# Altium footprint library ThanhNT.PcbLib: 579 footprints (part 22 of 37)
Each footprint in its own frame and in the unit in brackets; x right, y up, seen from the top. Pads: shape width x height; smd on the part's side, far side on the other; paste and mask are expansions set on the pad; w line width, h text height; cw(c..) or ccw(c..) is an arc to the next point about the centre after c.
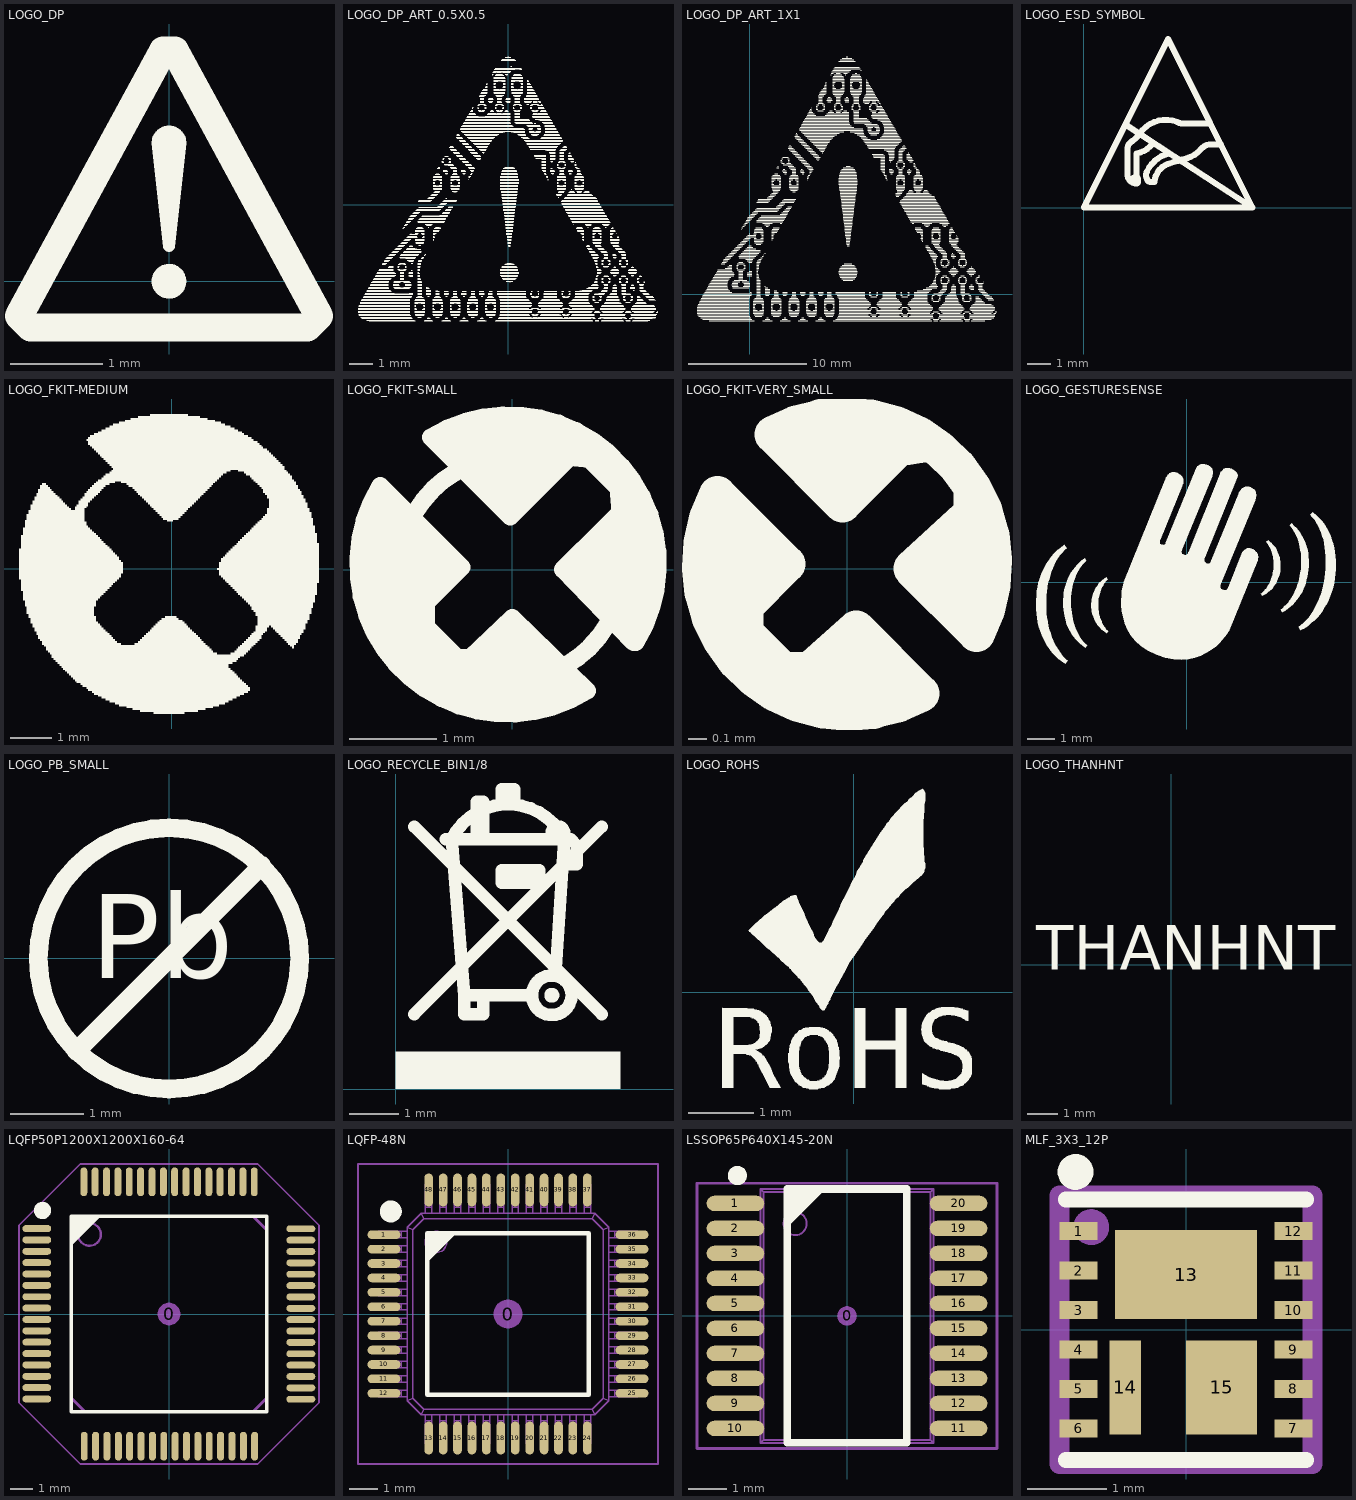
[diagram p21: the footprints below, top view; thin cyan lines are the x and y axes]

## LOGO_DP [mm] "Dangerous Prototype Logo"
Top Overlay:
  circle w0.127: c0,0 r0.125
  region: -0.102,0.102 0.076,0.102 0.076,-0.076 -0.102,-0.076
  region: 0.025,0.914 0.138,1.575 -0.138,1.575 -0.025,0.914
  lines w0.127: -0.125,1.5 cw(c0,1.5) 0.125,1.5 0,0.381 -0.125,1.5
  lines w0.305: -1.625,-0.375 -1.5,-0.5 1.5,-0.5 1.625,-0.375 0.062,2.5 -0.062,2.5 -1.625,-0.375

## LOGO_DP_ART_0.5X0.5 [mm] "Dangerous Prototype Logo"
Top Overlay:
  drawing of 3030 lines, arcs and shapes, not listed

## LOGO_DP_ART_1X1 [mm] "Dangerous Prototype Logo"
Top Overlay:
  drawing of 6057 lines, arcs and shapes, not listed

## LOGO_ESD_SYMBOL [mm]
Top Overlay:
  lines w0.254: 1.778,3.492 7.112,0 ; 2.032,1.143 cw(c2.159,1.143) 2.159,1.27 2.222,1.27 ; 2.921,2.73 cw(c2.072,3.294) 2.223,2.286 2.222,1.27 ; 2.946,1.079 2.794,1.079 cw(c2.857,1.27) 2.667,1.206 cw(c2.985,1.365) 2.667,1.524 cw(c3.905,0.953) 3.62,2.286 ; 2.985,1.08 cw(c3.842,1.032) 3.556,1.842 cw(c4.821,-1.745) 4,1.969 ; 4.127,2.032 ccw(c3.985,3.286) 4.953,2.477 cw(c5.398,2.064) 5.461,2.667 5.779,2.667 ; 2.222,1.27 cw(c2.222,1.206) 2.286,1.206 2.286,1.079 cw(c2.223,1.079) 2.222,1.016 cw(c2.222,1.397) 1.841,1.397 1.841,2.476 cw(c2.201,2.477) 2.032,2.794 ccw(c1.556,3.588) 2.349,3.112 cw(c3.47,2.345) 3.937,3.619 ccw(c4.122,3.85) 4.154,3.556 5.334,3.556 ; 5.334,3.556 3.556,7.112 0,0 7.112,0 ; 5.334,3.556 5.779,2.667 ; 5.779,2.667 7.112,0

## LOGO_FKIT-MEDIUM [mm]
Top Overlay:
  drawing of 314 lines, arcs and shapes, not listed

## LOGO_FKIT-SMALL [mm]
Top Overlay:
  lines w0.203: -1.676,0.432 -0.991,-0.203 -1.067,-0.33 -1.651,0.254 -1.651,0.025 -1.067,-0.533 -1.092,-0.686 -1.651,-0.178 -1.575,-0.406 -0.229,-1.575 -0.584,-1.448 -1.499,-0.61 -0.864,-1.372 ; -1.575,0.584 -0.838,-0.127 ; -1.549,0.787 -0.813,0.025 ; -1.118,0.66 cw(c-0.038,0.038) -0.66,1.118 ; -0.787,1.549 0.762,1.499 ; -0.737,1.397 0.94,1.372 ; -0.584,-1.118 -0.051,-1.549 ; -0.533,1.245 0.483,1.245 ; -0.508,1.651 0.508,1.626 ; -0.406,1.118 0.356,1.118 ; -0.356,-1.092 0.127,-1.549 ; -0.305,-0.965 0.33,-1.499 ; -0.305,0.965 0.152,0.965 ; -0.178,-0.813 0.533,-1.473 ; -0.102,0.813 0.051,0.838 ; -0.076,-0.737 0.635,-1.346 ; 0.635,-1.092 ccw(c0.013,-0.013) 1.092,-0.635 ; 0.686,0.051 1.575,-0.076 ; 0.787,-0.076 1.575,-0.229 ; 0.864,0.178 1.676,0.076 ; 0.94,-0.229 1.549,-0.381 ; 0.991,1.321 1.219,1.118 ; 1.041,0.33 1.6,0.254 ; 1.118,-0.406 1.422,-0.508 ; 1.295,-0.559 1.372,-0.686 ; 1.295,0.584 1.473,0.559 ; 1.295,0.914 1.448,0.889 ; 1.321,0.762 1.499,0.737 ; 1.397,-0.838 0.584,0 1.067,0.483 ; 1.422,-0.838 ccw(c-0.038,0.064) -0.94,1.524 -0.025,0.61 0.66,1.295 0.889,1.27 1.219,0.94 1.245,0.66 1.067,0.483 ; 1.575,0.406 1.067,0.483 ; -1.524,0.965 ccw(c-0.054,0.064) 0.864,-1.397 0,-0.559 -0.483,-1.016 -0.635,-1.016 -0.991,-0.66 -0.991,-0.381 -0.584,0.025 -1.524,0.965

## LOGO_FKIT-VERY_SMALL [mm]
Top Overlay:
  lines w0.203: -0.686,-0.152 -0.66,0.203 ; -0.559,-0.127 -0.533,0.102 ; -0.178,0.635 0,0.711 ; -0.152,-0.66 0.229,-0.66 ; -0.051,0.584 0.203,0.737 ; -0.025,-0.508 0.152,-0.533 ; 0.432,0.686 0.279,0.66 -0.025,0.356 -0.406,0.737 cw(c-0.009,0.025) 0.711,-0.356 0.356,0 0.686,0.305 0.686,0.432 ; 0.533,-0.025 0.686,0.178 ; 0.635,-0.178 0.686,0.025 ; -0.711,0.406 ccw(c0.009,0.025) 0.406,-0.686 0.051,-0.33 -0.203,-0.559 -0.356,-0.559 -0.559,-0.356 -0.559,-0.203 -0.33,0.025 -0.711,0.406

## LOGO_GESTURESENSE [mm] "Logo Gesturesense(TM)"
Top Overlay:
  drawing of 7 lines, arcs and shapes, not listed

## LOGO_PB_SMALL [mm]
Top Overlay:
  circle w0.254: c0,0 r1.778
  lines w0.254: -1.265,-1.265 1.265,1.265
  text "Pb" at -1.065,-0.646 h1.97

## LOGO_RECYCLE_BIN1/8 [mm]
Top Overlay:
  circle w0.254: c3.175,1.905 r0.025
  circle w0.254: c3.175,1.905 r0.402
  circle w0.254: c3.302,5.207 r0.127
  rectangle: 0,0 4.572,0.762
  lines w0.254: 0.381,1.524 3.429,4.572 ; 0.381,5.334 4.191,1.524 ; 1.016,5.08 1.143,5.08 ; 2.769,1.905 1.778,1.905 ; 3.251,2.311 3.429,5.08 ; 4.191,5.334 3.429,4.572 ; 1.143,5.08 cw(c2.286,4.508) 3.429,5.08 ; 1.143,5.08 1.397,1.905 ; 1.143,5.08 1.651,5.08 ; 1.397,1.905 1.778,1.905 ; 1.397,1.905 1.397,1.524 1.778,1.524 1.778,1.905 ; 1.651,5.08 1.778,5.08 ; 1.651,5.08 1.651,5.842 1.778,5.842 1.778,5.08 ; 1.778,5.08 3.429,5.08 ; 3.429,4.572 3.683,4.572 3.683,4.953 3.556,5.08 3.429,5.08 ; 2.159,4.191 2.159,4.445 2.921,4.445 2.921,4.191 2.159,4.191 ; 2.159,5.842 2.159,6.096 2.413,6.096 2.413,5.842 2.159,5.842

## LOGO_ROHS [mm] "RoHS Logo"
Top Overlay:
  drawing of 7 lines, arcs and shapes, not listed

## LOGO_THANHNT [mm]
Top Overlay:
  text "THANHNT" at -4.496,-0.66 h2.54

## LQFP50P1200X1200X160-64 [mil] "Thin Quad Flat Pack, 64 pins, 0.5mm pitch, 12mm lead span, body 10x10mm, 0.1mm body height, max tolerances, IPC Medium Density"
height 62.99
pads (65):
  round 39.37 on Mech15: 0(0,0)
  oval 50x12 smd: 1(-229,148) 2(-229,128.31) 3(-229,108.63) 4(-229,88.94) 5(-229,69.26) 6(-229,49.57) 7(-229,29.89) 8(-229,10.2) 9(-229,-9.48) 10(-229,-29.17) 11(-229,-48.85) 12(-229,-68.54) 13(-229,-88.22) 14(-229,-107.91) 15(-229,-127.59) 16(-229,-147.28) 33(228.5,-147.64) 34(228.5,-127.95) 35(228.5,-108.27) 36(228.5,-88.58) 37(228.5,-68.9) 38(228.5,-49.21) 39(228.5,-29.53) 40(228.5,-9.84) 41(228.5,9.84) 42(228.5,29.53) 43(228.5,49.21) 44(228.5,68.9) 45(228.5,88.58) 46(228.5,108.27) 47(228.5,127.95) 48(228.5,147.64)
  oval 12x50 smd: 17(-146.85,-229) 18(-127.17,-229) 19(-107.48,-229) 20(-87.8,-229) 21(-68.11,-229) 22(-48.43,-229) 23(-28.74,-229) 24(-9.06,-229) 25(10.63,-229) 26(30.32,-229) 27(50,-229) 28(69.69,-229) 29(89.37,-229) 30(109.06,-229) 31(128.74,-229) 32(148.43,-229) 49(147.69,229) 50(128,229) 51(108.31,229) 52(88.63,229) 53(68.94,229) 54(49.26,229) 55(29.57,229) 56(9.89,229) 57(-9.8,229) 58(-29.48,229) 59(-49.17,229) 60(-68.85,229) 61(-88.54,229) 62(-108.22,229) 63(-127.91,229) 64(-147.59,229)
Top Overlay:
  circle w15: c-219.06,179.37 r7.5
  region: -169.06,169.06 -118.35,169.06 -169.06,118.35
  lines w6: -169.29,-169.29 -169.29,169.29 169.29,169.29 169.29,-169.29 -169.29,-169.29
Mechanical 13:
  circle w3.94: c-137.8,137.8 r19.68
  lines w5: -169.29,-145.67 -169.29,145.67 -145.67,169.29 145.67,169.29 169.29,145.67 169.29,-145.67 145.67,-169.29 -145.67,-169.29 -169.29,-145.67
Mechanical 15:
  lines w3: -259.84,-153.54 -259.84,153.54 -153.54,259.84 153.54,259.84 259.84,153.54 259.84,-153.54 153.54,-259.84 -153.54,-259.84 -259.84,-153.54
3D body "LQFP50P1200X1200X160-64.STEP": height 62.48, standoff -0.51, extent -240.15,-240.15 240.16,240.16

## LQFP-48N [mm] "Thin QFP, 48-Leads, Body 7x7mm, Pitch 0.5mm, IPC Medium Density"
height 1.6
pads (49):
  round 1 on Mech15: 0(0,0)
  oval 1.143x0.3 smd: 1(-4.3,2.75) 2(-4.3,2.25) 3(-4.3,1.75) 4(-4.3,1.25) 5(-4.3,0.75) 6(-4.3,0.25) 7(-4.3,-0.25) 8(-4.3,-0.75) 9(-4.3,-1.25) 10(-4.3,-1.75) 11(-4.3,-2.25) 12(-4.3,-2.75) 25(4.3,-2.75) 26(4.3,-2.25) 27(4.3,-1.75) 28(4.3,-1.25) 29(4.3,-0.75) 30(4.3,-0.25) 31(4.3,0.25) 32(4.3,0.75) 33(4.3,1.25) 34(4.3,1.75) 35(4.3,2.25) 36(4.3,2.75)
  oval 0.3x1.143 smd: 13(-2.75,-4.3) 14(-2.25,-4.3) 15(-1.75,-4.3) 16(-1.25,-4.3) 17(-0.75,-4.3) 18(-0.25,-4.3) 19(0.25,-4.3) 20(0.75,-4.3) 21(1.25,-4.3) 22(1.75,-4.3) 23(2.25,-4.3) 24(2.75,-4.3) 37(2.75,4.3) 38(2.25,4.3) 39(1.75,4.3) 40(1.25,4.3) 41(0.75,4.3) 42(0.25,4.3) 43(-0.25,4.3) 44(-0.75,4.3) 45(-1.25,4.3) 46(-1.75,4.3) 47(-2.25,4.3) 48(-2.75,4.3)
Top Overlay:
  circle w0.381: c-4.064,3.556 r0.191
  region: -2.794,2.794 -1.794,2.794 -2.794,1.794
  lines w0.152: -2.794,-2.794 -2.794,2.794 2.794,2.794 2.794,-2.794 -2.794,-2.794
Mechanical 13:
  drawing of 361 lines, arcs and shapes, not listed
Mechanical 15:
  lines w0.076: -5.2,-5.2 -5.2,5.2 5.2,5.2 5.2,-5.2 -5.2,-5.2
3D body "LQFP-48.STEP": height 1.59, standoff -0.01, extent -4.5,-4.5 4.5,4.5

## LSSOP65P640X145-20N [mm] "LSSOP, 20-Leads, Body 6.6x4.5mm (max), Pitch 0.65mm, IPC Medium Density"
height 1.45
pads (21):
  round 0.508 on Mech15 mask+0.127: 0(0,0)
  oval 1.5x0.4 smd paste-1 mask+0.127: 1(-2.9,2.925) 2(-2.9,2.275) 3(-2.9,1.625) 4(-2.9,0.975) 5(-2.9,0.325) 6(-2.9,-0.325) 7(-2.9,-0.975) 8(-2.9,-1.625) 9(-2.9,-2.275) 10(-2.9,-2.925) 11(2.9,-2.925) 12(2.9,-2.275) 13(2.9,-1.625) 14(2.9,-0.975) 15(2.9,-0.325) 16(2.9,0.325) 17(2.9,0.975) 18(2.9,1.625) 19(2.9,2.275) 20(2.9,2.925)
Top Overlay:
  circle w0.25: c-2.85,3.65 r0.125
  region: -1.55,3.3 -0.55,3.3 -1.55,2.3
  lines w0.2: -1.55,-3.3 1.55,-3.3 1.55,3.3 -1.55,3.3 -1.55,-3.3
Top Paste:
  region: 3.5,-2.775 2.3,-2.775 2.3,-3.075 3.5,-3.075
  region: 3.5,-2.125 2.3,-2.125 2.3,-2.425 3.5,-2.425
  region: 3.5,-1.475 2.3,-1.475 2.3,-1.775 3.5,-1.775
  rectangle: -3.5,-1.775 -2.3,-1.475
  rectangle: -3.5,-2.425 -2.3,-2.125
  rectangle: -3.5,-3.075 -2.3,-2.775
  rectangle: -3.5,-1.125 -2.3,-0.825
  rectangle: -3.5,-0.475 -2.3,-0.175
  rectangle: -3.5,0.175 -2.3,0.475
  rectangle: -3.5,0.825 -2.3,1.125
  rectangle: -3.5,1.475 -2.3,1.775
  rectangle: -3.5,2.125 -2.3,2.425
  rectangle: -3.5,2.775 -2.3,3.075
  region: 3.5,3.075 2.3,3.075 2.3,2.775 3.5,2.775
  region: 3.5,2.425 2.3,2.425 2.3,2.125 3.5,2.125
  region: 3.5,1.775 2.3,1.775 2.3,1.475 3.5,1.475
  region: 3.5,1.125 2.3,1.125 2.3,0.825 3.5,0.825
  region: 3.5,0.475 2.3,0.475 2.3,0.175 3.5,0.175
  region: 3.5,-0.175 2.3,-0.175 2.3,-0.475 3.5,-0.475
  region: 3.5,-0.825 2.3,-0.825 2.3,-1.125 3.5,-1.125
Mechanical 13:
  drawing of 153 lines, arcs and shapes, not listed
Mechanical 15:
  lines w0.076: -3.9,-3.45 3.9,-3.45 3.9,3.45 -3.9,3.45 -3.9,-3.45
3D body "LSSOP65P640X145-20N.STEP": height 1.45, standoff 0, extent -3.3,-3.3 3.3,3.3

## MLF_3X3_12P [mm]
pads (15):
  rect 0.48x0.23 smd mask+0.076: 1(-1.36,1.25) 2(-1.36,0.75) 3(-1.36,0.25) 4(-1.36,-0.25) 5(-1.36,-0.75) 6(-1.36,-1.25) 7(1.36,-1.25) 8(1.36,-0.75) 9(1.36,-0.25) 10(1.36,0.25) 11(1.36,0.75) 12(1.36,1.25)
  rect 1.8x1.125 smd mask+0.025: 13(0,0.699)
  rect 0.4x1.19 smd mask+0.076: 14(-0.77,-0.73)
  rect 0.9x1.19 smd mask+0.025: 15(0.45,-0.73)
Top Overlay:
  circle w0.254: c-1.4,2 r0.1
  lines w0.2: -1.524,-1.651 1.524,-1.651 ; -1.524,1.651 1.524,1.651
Top Solder:
  region: 1.6,-0.6 0.8,-0.6 0.8,-1.4 1.6,-1.4 1.6,-1.1 1.1,-1.1 1.1,-0.9 1.6,-0.9
Mechanical 16:
  circle w0.254: c-1.2,1.3 r0.1
  lines w0.254: -1.6,-1.7 -1.6,1.7 1.6,1.7 1.6,-1.7 -1.6,-1.7
3D body: height 0.9, standoff 0, extent -1.524,-1.651 1.524,1.651